# Altium schematic symbol library IC_ADI.SCHLIB: 3169 symbols (part 130 of 181) (continued)
## AD8628WARTZ-R7 (continued)
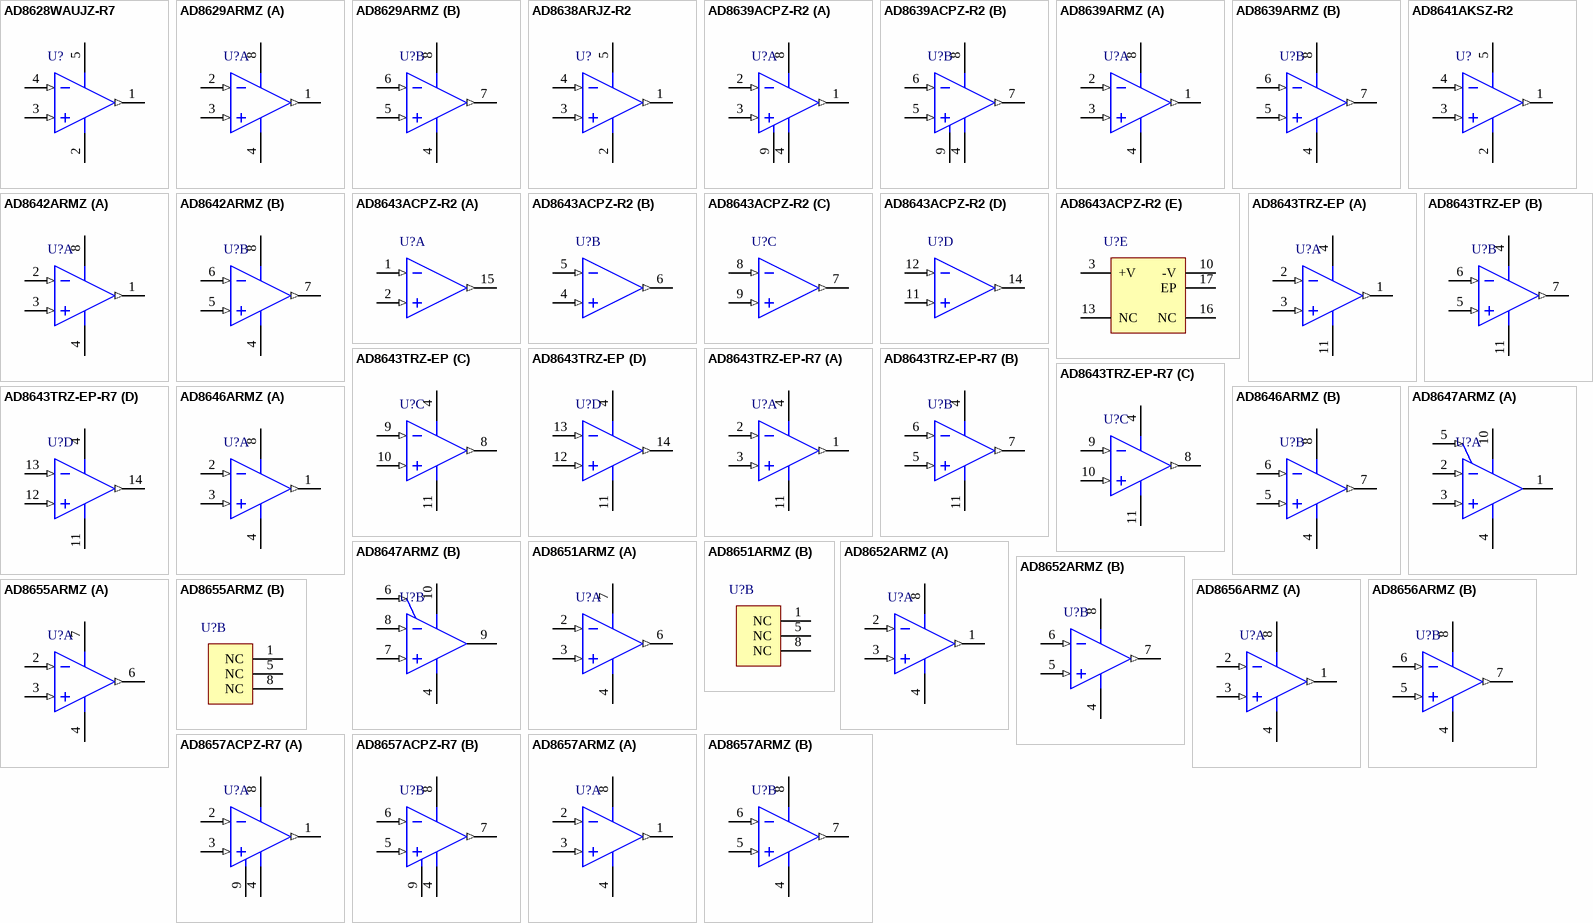
[diagram p99: symbols AD8628WAUJZ-R7 to AD8657ARMZ]

## AD8628WAUJZ-R7
designator U?
Single Channel RRIO Operational Amplifier, 2.5 MHz BW, 1 V/us SR, Automotive, 5-pin SOT23 (UJ-5), Reel; Generic Part Number: AD8628; PartNumber: AD8628WAUJZ-R7; Amplifiers Per Package: 1; Automotive Qualified: Yes; Input Bias Current: 30pA; Input Offset Voltage: 1uV; Iq/Amp: 1.1mA; Slew Rate: 1V/us; Small Signal Bandwidth: 2.5MHz; V Span Max: 6V; V Span Min: 2.7V; DatasheetVersion: Rev. I; PackageVersion: 100708-A; PackageReference: UJ-5; PackageDescription: 5-Pin Thin Small Outline Transistor Package, Body 2.9 x 1.6 mm, Pitch 0.95 mm; Supplier Part Number 1: AD8628WAUJZ-R7TR-ND; Supplier Part Number 2: AD8628WAUJZ-R7CT-ND; Supplier Part Number 3: AD8628WAUJZ-R7DKR-ND; Mounting Technology: Surface Mount; Code_JEDEC: MO-193-AB; ComponentLink1Description: Manufacturer URL; ComponentLink2Description: Datasheet; ComponentLink3Description: Package Specification; ComponentLink4Description: Reference Circuit
footprint SOT23-5 (Footprint not found)
pins: 1 OUT (out), 2 -V (power), 3 +IN (in), 4 -IN (in), 5 +V (power)

## AD8629ARMZ
designator U?
Double Channel RRIO Operational Amplifier, 2.5 MHz BW, 1 V/us SR, Industrial, 8-pin SOP (RM-8), Tube; Generic Part Number: AD8629; PartNumber: AD8629ARMZ; Amplifiers Per Package: 2; Automotive Qualified: Yes; Input Bias Current: 30pA; Input Offset Voltage: 1uV; Iq/Amp: 1.1mA; Slew Rate: 1V/us; Small Signal Bandwidth: 2.5MHz; V Span Max: 6V; V Span Min: 2.7V; DatasheetVersion: Rev. I; PackageReference: RM-8; PackageDescription: 8-Pin Mini Small Outline Package, Body 3 x 3 mm, Pitch 0.65 mm; Supplier Part Number 1: AD8629ARMZ-ND; Supplier Part Number 2: 19P8311; Mounting Technology: Surface Mount; Code_JEDEC: MO-187-AA; ComponentLink1Description: Manufacturer URL; ComponentLink2Description: Datasheet; ComponentLink3Description: Package Specification; ComponentLink4Description: Reference Circuit
footprint VSSOP8_0.65 (Footprint not found)
pins on every part: 4 -V (power), 8 +V (power)
part A pins: 1 OUT A (out), 2 -IN A (in), 3 +IN A (in)
part B pins: 5 +IN B (in), 6 -IN B (in), 7 OUT B (out)

## AD8638ARJZ-R2
designator U?
Single Channel Rail-to-Rail Operational Amplifier, 1.5 MHz BW, 2 V/us SR, Industrial, 5-pin SOT23 (RJ-5), Reel; Generic Part Number: AD8638; PartNumber: AD8638ARJZ-R2; Amplifiers Per Package: 1; Input Bias Current: 1pA; Input Offset Voltage: 3uV; Iq/Amp: 1.5mA; Slew Rate: 2V/us; Small Signal Bandwidth: 1.5MHz; V Span Max: 16V; V Span Min: 5V; DatasheetVersion: Rev. F; PackageVersion: 121608-A; PackageReference: RJ-5; PackageDescription: 5-Pin Small Outline Transistor Package, Body 2.9 x 1.6 mm, Pitch 0.95 mm; Supplier Part Number 1: AD8638ARJZ-R2TR-ND; Supplier Part Number 2: AD8638ARJZ-R2CT-ND; Supplier Part Number 3: AD8638ARJZ-R2DKR-ND; Supplier Part Number 4: 1701178; Supplier Part Number 5: 89M5025; Mounting Technology: Surface Mount; Code_JEDEC: MO-178-AA; ComponentLink1Description: Manufacturer URL; ComponentLink2Description: Datasheet; ComponentLink3Description: Package Specification; ComponentLink4Description: Reference Circuit
footprint SOT23-5 (Footprint not found)
pins: 1 OUT (out), 2 -V (power), 3 +IN (in), 4 -IN (in), 5 +V (power)

## AD8639ACPZ-R2
designator U?
Double Channel Rail-to-Rail Operational Amplifier, 1.5 MHz BW, 2 V/us SR, Industrial, 8-pin SON (CP-8-5), Reel; Generic Part Number: AD8639; PartNumber: AD8639ACPZ-R2; Amplifiers Per Package: 2; Automotive Qualified: Yes; Input Bias Current: 1pA; Input Offset Voltage: 3uV; Iq/Amp: 1.5mA; Slew Rate: 2V/us; Small Signal Bandwidth: 1.5MHz; V Span Max: 16V; V Span Min: 5V; DatasheetVersion: Rev. F; PackageVersion: 031208-A; PackageReference: CP-8-5; PackageDescription: 8-Pin Lead Frame Chip Scale Package, Body 3 x 3 mm, Pitch 0.5 mm; Supplier Part Number 1: AD8639ACPZ-R2-ND; Mounting Technology: Surface Mount; ComponentLink1Description: Manufacturer URL; ComponentLink2Description: Datasheet; ComponentLink3Description: Package Specification
footprint DFN8_0.5-PAD(3X3) (Footprint not found)
pins on every part: 4 -V (power), 8 +V (power), 9 EP (power)
part A pins: 1 OUT A (out), 2 -IN A (in), 3 +IN A (in)
part B pins: 5 +IN B (in), 6 -IN B (in), 7 OUT B (out)

## AD8639ARMZ
designator U?
Double Channel Rail-to-Rail Operational Amplifier, 1.5 MHz BW, 2 V/us SR, Industrial, 8-pin SOP (RM-8), Tube; Generic Part Number: AD8639; PartNumber: AD8639ARMZ; Amplifiers Per Package: 2; Automotive Qualified: Yes; Input Bias Current: 1pA; Input Offset Voltage: 3uV; Iq/Amp: 1.5mA; Slew Rate: 2V/us; Small Signal Bandwidth: 1.5MHz; V Span Max: 16V; V Span Min: 5V; DatasheetVersion: Rev. F; PackageReference: RM-8; PackageDescription: 8-Pin Mini Small Outline Package, Body 3 x 3 mm, Pitch 0.65 mm; Supplier Part Number 1: AD8639ARMZ-ND; Supplier Part Number 2: 34P3248; Mounting Technology: Surface Mount; Code_JEDEC: MO-187-AA; ComponentLink1Description: Manufacturer URL; ComponentLink2Description: Datasheet; ComponentLink3Description: Package Specification
footprint VSSOP8_0.65 (Footprint not found)
pins on every part: 4 -V (power), 8 +V (power)
part A pins: 1 OUT A (out), 2 -IN A (in), 3 +IN A (in)
part B pins: 5 +IN B (in), 6 -IN B (in), 7 OUT B (out)

## AD8641AKSZ-R2
designator U?
Single Channel Very Low Input Bias Current Operational Amplifier, 3 MHz BW, 2 V/us SR, Industrial, 5-pin SOT23 (KS-5), Reel; Generic Part Number: AD8641; PartNumber: AD8641AKSZ-R2; Amplifiers Per Package: 1; Input Bias Current: 250fA; Input Offset Voltage: 50uV; Iq/Amp: 250礎; Slew Rate: 2V/us; Small Signal Bandwidth: 3MHz; V Span Max: 26V; V Span Min: 5V; DatasheetVersion: Rev. E; PackageVersion: 072809-A; PackageReference: KS-5; PackageDescription: 5-Pin Thin Shrink Small Outline Transistor Package, Body 2 x 1.25 mm, Pitch 0.65 mm; Supplier Part Number 1: AD8641AKSZ-R2-ND; Supplier Part Number 2: 19M8935; Mounting Technology: Surface Mount; Code_JEDEC: MO-203-AA; ComponentLink1Description: Manufacturer URL; ComponentLink2Description: Datasheet; ComponentLink3Description: Package Specification; ComponentLink4Description: Reference Circuit
footprint SOT353 (Footprint not found)
pins: 1 OUT (out), 2 VEE (power), 3 +IN (in), 4 -IN (in), 5 VCC (power)

## AD8642ARMZ
designator U?
Double Channel Very Low Input Bias Current Operational Amplifier, 3.5 MHz BW, 3 V/us SR, Industrial, 8-pin SOP (RM-8), Tube; Generic Part Number: AD8642; PartNumber: AD8642ARMZ; Amplifiers Per Package: 2; Input Bias Current: 250fA; Input Offset Voltage: 50uV; Iq/Amp: 290uA; Slew Rate: 3V/us; Small Signal Bandwidth: 3.5MHz; V Span Max: 26V; V Span Min: 5V; DatasheetVersion: Rev. E; PackageReference: RM-8; PackageDescription: 8-Pin Mini Small Outline Package, Body 3 x 3 mm, Pitch 0.65 mm; Supplier Part Number 1: AD8642ARMZ-ND; Supplier Part Number 2: 45P6468; Mounting Technology: Surface Mount; Code_JEDEC: MO-187-AA; ComponentLink1Description: Manufacturer URL; ComponentLink2Description: Datasheet; ComponentLink3Description: Package Specification
footprint VSSOP8_0.65 (Footprint not found)
pins on every part: 4 -V (power), 8 +V (power)
part A pins: 1 OUT A (out), 2 -IN A (in), 3 +IN A (in)
part B pins: 5 +IN B (in), 6 -IN B (in), 7 OUT B (out)

## AD8643ACPZ-R2
designator U?
Quad Channel Very Low Input Bias Current Operational Amplifier, 3.5 MHz BW, 3 V/us SR, Industrial, 16-pin QFN (CP-16-3), Reel; Generic Part Number: AD8643; PartNumber: AD8643ACPZ-R2; Amplifiers Per Package: 4; Input Bias Current: 250fA; Input Offset Voltage: 50uV; Iq/Amp: 290uA; Slew Rate: 3V/us; Small Signal Bandwidth: 3.5MHz; V Span Max: 26V; V Span Min: 5V; DatasheetVersion: Rev. E; PackageReference: CP-16-3; PackageDescription: 16-Pin Lead Frame Chip Scale Package, Body 3 x 3 mm, Pitch 0.5 mm; Supplier Part Number 1: AD8643ACPZ-R2TR-ND; Supplier Part Number 2: AD8643ACPZ-R2CT-ND; Supplier Part Number 3: AD8643ACPZ-R2DKR-ND; Supplier Part Number 4: 19M8937; Mounting Technology: Surface Mount; Code_JEDEC: MO-220-VEED-2; ComponentLink1Description: Manufacturer URL; ComponentLink2Description: Datasheet; ComponentLink3Description: Package Specification
footprint QFN16_0.5-PAD(3X3) (Footprint not found)
part A pins: 1 -IN A (in), 2 +IN A (in), 15 OUT A (out)
part B pins: 4 +IN B (in), 5 -IN B (in), 6 OUT B (out)
part C pins: 7 OUT C (out), 8 -IN C (in), 9 +IN C (in)
part D pins: 11 +IN D (in), 12 -IN D (in), 14 OUT D (out)
part E pins: 3 +V (power), 10 -V (power), 13 NC, 16 NC, 17 EP (power) "IT IS RECOMMENDED TO CONNECT THE EXPOSED PAD TO V-."

## AD8643TRZ-EP
designator U?
Quad Channel Very Low Input Bias Current Operational Amplifier, 3.5 MHz BW, 3 V/us SR, Military, 14-pin SOIC (R-14), Tube; Generic Part Number: AD8643; PartNumber: AD8643TRZ-EP; Amplifiers Per Package: 4; Input Bias Current: 250fA; Input Offset Voltage: 50uV; Iq/Amp: 290uA; Slew Rate: 3V/us; Small Signal Bandwidth: 3.5MHz; V Span Max: 26V; V Span Min: 5V; DatasheetVersion: Rev. E; PackageVersion: 060606-A; PackageReference: R-14; PackageDescription: 14-Pin Standard Small Outline Package, Body 8.65 x 3.9 mm, Pitch 1.27 mm; Supplier Part Number 1: AD8643TRZ-EP-ND; Mounting Technology: Surface Mount; Code_JEDEC: MS-012-AB; ComponentLink1Description: Manufacturer URL; ComponentLink2Description: Datasheet; ComponentLink3Description: Package Specification
footprint SOIC14_1.27 (Footprint not found)
pins on every part: 4 +V (power), 11 -V (power)
part A pins: 1 OUT A (out), 2 -IN A (in), 3 +IN A (in)
part B pins: 5 +IN B (in), 6 -IN B (in), 7 OUT B (out)
part C pins: 8 OUT C (out), 9 -IN C (in), 10 +IN C (in)
part D pins: 12 +IN D (in), 13 -IN D (in), 14 OUT D (out)

## AD8643TRZ-EP-R7
designator U?
Quad Channel Very Low Input Bias Current Operational Amplifier, 3.5 MHz BW, 3 V/us SR, Military, 14-pin SOIC (R-14), Reel; Generic Part Number: AD8643; PartNumber: AD8643TRZ-EP-R7; Amplifiers Per Package: 4; Input Bias Current: 250fA; Input Offset Voltage: 50uV; Iq/Amp: 290uA; Slew Rate: 3V/us; Small Signal Bandwidth: 3.5MHz; V Span Max: 26V; V Span Min: 5V; DatasheetVersion: Rev. E; PackageVersion: 060606-A; PackageReference: R-14; PackageDescription: 14-Pin Standard Small Outline Package, Body 8.65 x 3.9 mm, Pitch 1.27 mm; Supplier Part Number 1: AD8643TRZ-EP-R7TR-ND; Supplier Part Number 2: AD8643TRZ-EP-R7CT-ND; Supplier Part Number 3: AD8643TRZ-EP-R7DKR-ND; Mounting Technology: Surface Mount; Code_JEDEC: MS-012-AB; ComponentLink1Description: Manufacturer URL; ComponentLink2Description: Datasheet; ComponentLink3Description: Package Specification
footprint SOIC14_1.27 (Footprint not found)
pins on every part: 4 +V (power), 11 -V (power)
part A pins: 1 OUT A (out), 2 -IN A (in), 3 +IN A (in)
part B pins: 5 +IN B (in), 6 -IN B (in), 7 OUT B (out)
part C pins: 8 OUT C (out), 9 -IN C (in), 10 +IN C (in)
part D pins: 12 +IN D (in), 13 -IN D (in), 14 OUT D (out)

## AD8646ARMZ
designator U?
Double Channel Wide Bandwidth Operational Amplifier, 24 MHz BW, 11 V/us SR, Industrial, 8-pin SOP (RM-8), Tube; Generic Part Number: AD8646; PartNumber: AD8646ARMZ; Amplifiers Per Package: 2; Automotive Qualified: Yes; Input Bias Current: 300fA; Input Offset Voltage: 600uV; Iq/Amp: 2mA; Slew Rate: 11V/us; Small Signal Bandwidth: 24MHz; V Span Max: 5.5V; V Span Min: 2.7V; DatasheetVersion: Rev. D; PackageReference: RM-8; PackageDescription: 8-Pin Mini Small Outline Package, Body 3 x 3 mm, Pitch 0.65 mm; Supplier Part Number 1: AD8646ARMZ-ND; Supplier Part Number 2: 2094200; Supplier Part Number 3: 34P3249; Mounting Technology: Surface Mount; Code_JEDEC: MO-187-AA; ComponentLink1Description: Manufacturer URL; ComponentLink2Description: Datasheet; ComponentLink3Description: Package Specification; ComponentLink4Description: Reference Circuit
footprint VSSOP8_0.65 (Footprint not found)
pins on every part: 4 -V (power), 8 +V (power)
part A pins: 1 OUT A (out), 2 -IN A (in), 3 +IN A (in)
part B pins: 5 +IN B (in), 6 -IN B (in), 7 OUT B (out)

## AD8647ARMZ
designator U?
Double Channel Wide Bandwidth Operational Amplifier, 24 MHz BW, 11 V/us SR, Industrial, 10-pin SOP (RM-10), Tube; Generic Part Number: AD8647; PartNumber: AD8647ARMZ; Amplifiers Per Package: 2; Input Bias Current: 300fA; Input Offset Voltage: 600uV; Iq/Amp: 2mA; Slew Rate: 11V/us; Small Signal Bandwidth: 24MHz; V Span Max: 5.5V; V Span Min: 2.7V; DatasheetVersion: Rev. D; PackageReference: RM-10; PackageDescription: 10-Pin Mini Small Outline Package, Body 3 x 3 mm, Pitch 0.5 mm; Supplier Part Number 1: AD8647ARMZ-ND; Supplier Part Number 2: 34P3250; Mounting Technology: Surface Mount; Code_JEDEC: MO-187-BA; ComponentLink1Description: Manufacturer URL; ComponentLink2Description: Datasheet; ComponentLink3Description: Package Specification
footprint VSSOP10_0.5 (Footprint not found)
pins on every part: 4 -V (power), 10 +V (power)
part A pins: 1 OUT A (hiz), 2 -IN A (in), 3 +IN A (in), 5 ~{SDA} (in)
part B pins: 6 ~{SDB} (in), 7 +IN B (in), 8 -IN B (in), 9 OUT B (hiz)

## AD8651ARMZ
designator U?
Single Channel RRIO Operational Amplifier, 50 MHz BW, 41 V/us SR, Industrial, 8-pin SOP (RM-8), Tube; Generic Part Number: AD8651; PartNumber: AD8651ARMZ; Amplifiers Per Package: 1; Input Bias Current: 1pA; Input Offset Voltage: 100uV; Iq/Amp: 9mA; Slew Rate: 41V/us; Small Signal Bandwidth: 50MHz; V Span Max: 5.5V; V Span Min: 2.7V; DatasheetVersion: Rev. C; PackageReference: RM-8; PackageDescription: 8-Pin Mini Small Outline Package, Body 3 x 3 mm, Pitch 0.65 mm; Supplier Part Number 1: AD8651ARMZ-ND; Supplier Part Number 2: 45P6469; Mounting Technology: Surface Mount; Code_JEDEC: MO-187-AA; ComponentLink1Description: Manufacturer URL; ComponentLink2Description: Datasheet; ComponentLink3Description: Package Specification
footprint VSSOP8_0.65 (Footprint not found)
part A pins: 2 -IN (in), 3 +IN (in), 4 -V (power), 6 OUT (out), 7 +V (power)
part B pins: 1 NC, 5 NC, 8 NC

## AD8652ARMZ
designator U?
Double Channel RRIO Operational Amplifier, 50 MHz BW, 41 V/us SR, Industrial, 8-pin SOP (RM-8), Tube; Generic Part Number: AD8652; PartNumber: AD8652ARMZ; Amplifiers Per Package: 2; Input Bias Current: 1pA; Input Offset Voltage: 100uV; Iq/Amp: 9mA; Slew Rate: 41V/us; Small Signal Bandwidth: 50MHz; V Span Max: 5.5V; V Span Min: 2.7V; DatasheetVersion: Rev. C; PackageReference: RM-8; PackageDescription: 8-Pin Mini Small Outline Package, Body 3 x 3 mm, Pitch 0.65 mm; Supplier Part Number 1: AD8652ARMZ-ND; Supplier Part Number 2: 45P6470; Mounting Technology: Surface Mount; Code_JEDEC: MO-187-AA; ComponentLink1Description: Manufacturer URL; ComponentLink2Description: Datasheet; ComponentLink3Description: Package Specification
footprint VSSOP8_0.65 (Footprint not found)
pins on every part: 4 -V (power), 8 +V (power)
part A pins: 1 OUT A (out), 2 -IN A (in), 3 +IN A (in)
part B pins: 5 +IN B (in), 6 -IN B (in), 7 OUT B (out)

## AD8655ARMZ
designator U?
Single Channel Low Offset Voltage Operational Amplifier, 28 MHz BW, 11 V/us SR, Industrial, 8-pin SOP (RM-8), Tube; Generic Part Number: AD8655; PartNumber: AD8655ARMZ; Amplifiers Per Package: 1; Input Bias Current: 1pA; Input Offset Voltage: 50uV; Iq/Amp: 4.5mA; Slew Rate: 11V/us; Small Signal Bandwidth: 28MHz; V Span Max: 5.5V; V Span Min: 2.7V; DatasheetVersion: Rev. B; PackageReference: RM-8; PackageDescription: 8-Pin Mini Small Outline Package, Body 3 x 3 mm, Pitch 0.65 mm; Supplier Part Number 1: AD8655ARMZ-ND; Supplier Part Number 2: 2112576; Supplier Part Number 3: 34P3251; Mounting Technology: Surface Mount; Code_JEDEC: MO-187-AA; ComponentLink1Description: Manufacturer URL; ComponentLink2Description: Datasheet; ComponentLink3Description: Package Specification; ComponentLink4Description: Reference Circuit
footprint VSSOP8_0.65 (Footprint not found)
part A pins: 2 -IN (in), 3 +IN (in), 4 -V (power), 6 OUT (out), 7 +V (power)
part B pins: 1 NC, 5 NC, 8 NC

## AD8656ARMZ
designator U?
Double Channel RRIO Operational Amplifier, 28 MHz BW, 11 V/us SR, Industrial, 8-pin SOP (RM-8), Tube; Generic Part Number: AD8656; PartNumber: AD8656ARMZ; Amplifiers Per Package: 2; Automotive Qualified: Yes; Input Bias Current: 1pA; Input Offset Voltage: 50uV; Iq/Amp: 4.5mA; Slew Rate: 11V/us; Small Signal Bandwidth: 28MHz; V Span Max: 5.5V; V Span Min: 2.7V; DatasheetVersion: Rev. B; PackageReference: RM-8; PackageDescription: 8-Pin Mini Small Outline Package, Body 3 x 3 mm, Pitch 0.65 mm; Supplier Part Number 1: AD8656ARMZ-ND; Supplier Part Number 2: 1858055; Supplier Part Number 3: 34P3252; Mounting Technology: Surface Mount; Code_JEDEC: MO-187-AA; ComponentLink1Description: Manufacturer URL; ComponentLink2Description: Datasheet; ComponentLink3Description: Package Specification
footprint VSSOP8_0.65 (Footprint not found)
pins on every part: 4 -V (power), 8 +V (power)
part A pins: 1 OUT A (out), 2 -IN A (in), 3 +IN A (in)
part B pins: 5 +IN B (in), 6 -IN B (in), 7 OUT B (out)

## AD8657ACPZ-R7
designator U?
Double Channel Single-Supply Operation Operational Amplifier, 200 KHz BW, 50 mV/us SR, Industrial, 8-pin SON (CP-8-11), Reel; Generic Part Number: AD8657; PartNumber: AD8657ACPZ-R7; Amplifiers Per Package: 2; Input Bias Current: 1pA; Input Offset Voltage: 350uV; Iq/Amp: 18uA; Small Signal Bandwidth: 200KHz; V Span Max: 18V; V Span Min: 2.7V; DatasheetVersion: Rev. B; PackageVersion: 01-24-2011-B; PackageReference: CP-8-11; PackageDescription: 8-Pin Lead Frame Chip Scale Package, Body 3 x 3 mm, Pitch 0.5 mm; Supplier Part Number 1: AD8657ACPZ-R7TR-ND; Supplier Part Number 2: AD8657ACPZ-R7CT-ND; Supplier Part Number 3: AD8657ACPZ-R7DKR-ND; Packing: Reel; Slew Rate: 50mV/us; Mounting Technology: Surface Mount; Code_JEDEC: MO-229-WEED; ComponentLink1Description: Manufacturer URL; ComponentLink2Description: Datasheet; ComponentLink3Description: Package Specification; ComponentLink4Description: Reference Circuit
footprint DFN8_0.5-PAD(3X3) (Footprint not found)
pins on every part: 4 -V (power) "Negative Supply Voltage.", 8 +V (power) "Positive Supply Voltage.", 9 EP "Exposed Pad (LFCSP Only). Connect the exposed pad to V? or leave it unconnected."
part A pins: 1 OUT A (out) "Output, Channel A.", 2 -IN A (in) "Inverting Input, Channel A.", 3 +IN A (in) "Noninverting Input, Channel A."
part B pins: 5 +IN B (in) "Noninverting Input, Channel B.", 6 -IN B (in) "Inverting Input, Channel B.", 7 OUT B (out) "Output, Channel B."

## AD8657ARMZ
designator U?
Double Channel Single-Supply Operation Operational Amplifier, 200 KHz BW, 50 mV/us SR, Industrial, 8-pin SOP (RM-8), Tube; Generic Part Number: AD8657; PartNumber: AD8657ARMZ; Amplifiers Per Package: 2; Input Bias Current: 1pA; Input Offset Voltage: 350uV; Iq/Amp: 18uA; Small Signal Bandwidth: 200KHz; V Span Max: 18V; V Span Min: 2.7V; DatasheetVersion: Rev. B; PackageReference: RM-8; PackageDescription: 8-Pin Mini Small Outline Package, Body 3 x 3 mm, Pitch 0.65 mm; Supplier Part Number 1: AD8657ARMZ-ND; Supplier Part Number 2: 1897110; Supplier Part Number 3: 31T9330; Packing: Tube; Slew Rate: 50mV/us; Mounting Technology: Surface Mount; Code_JEDEC: MO-187-AA; ComponentLink1Description: Manufacturer URL; ComponentLink2Description: Datasheet; ComponentLink3Description: Package Specification; ComponentLink4Description: Reference Circuit
footprint VSSOP8_0.65 (Footprint not found)
pins on every part: 4 -V (power), 8 +V (power)
part A pins: 1 OUT A (out), 2 -IN A (in), 3 +IN A (in)
part B pins: 5 +IN B (in), 6 -IN B (in), 7 OUT B (out)

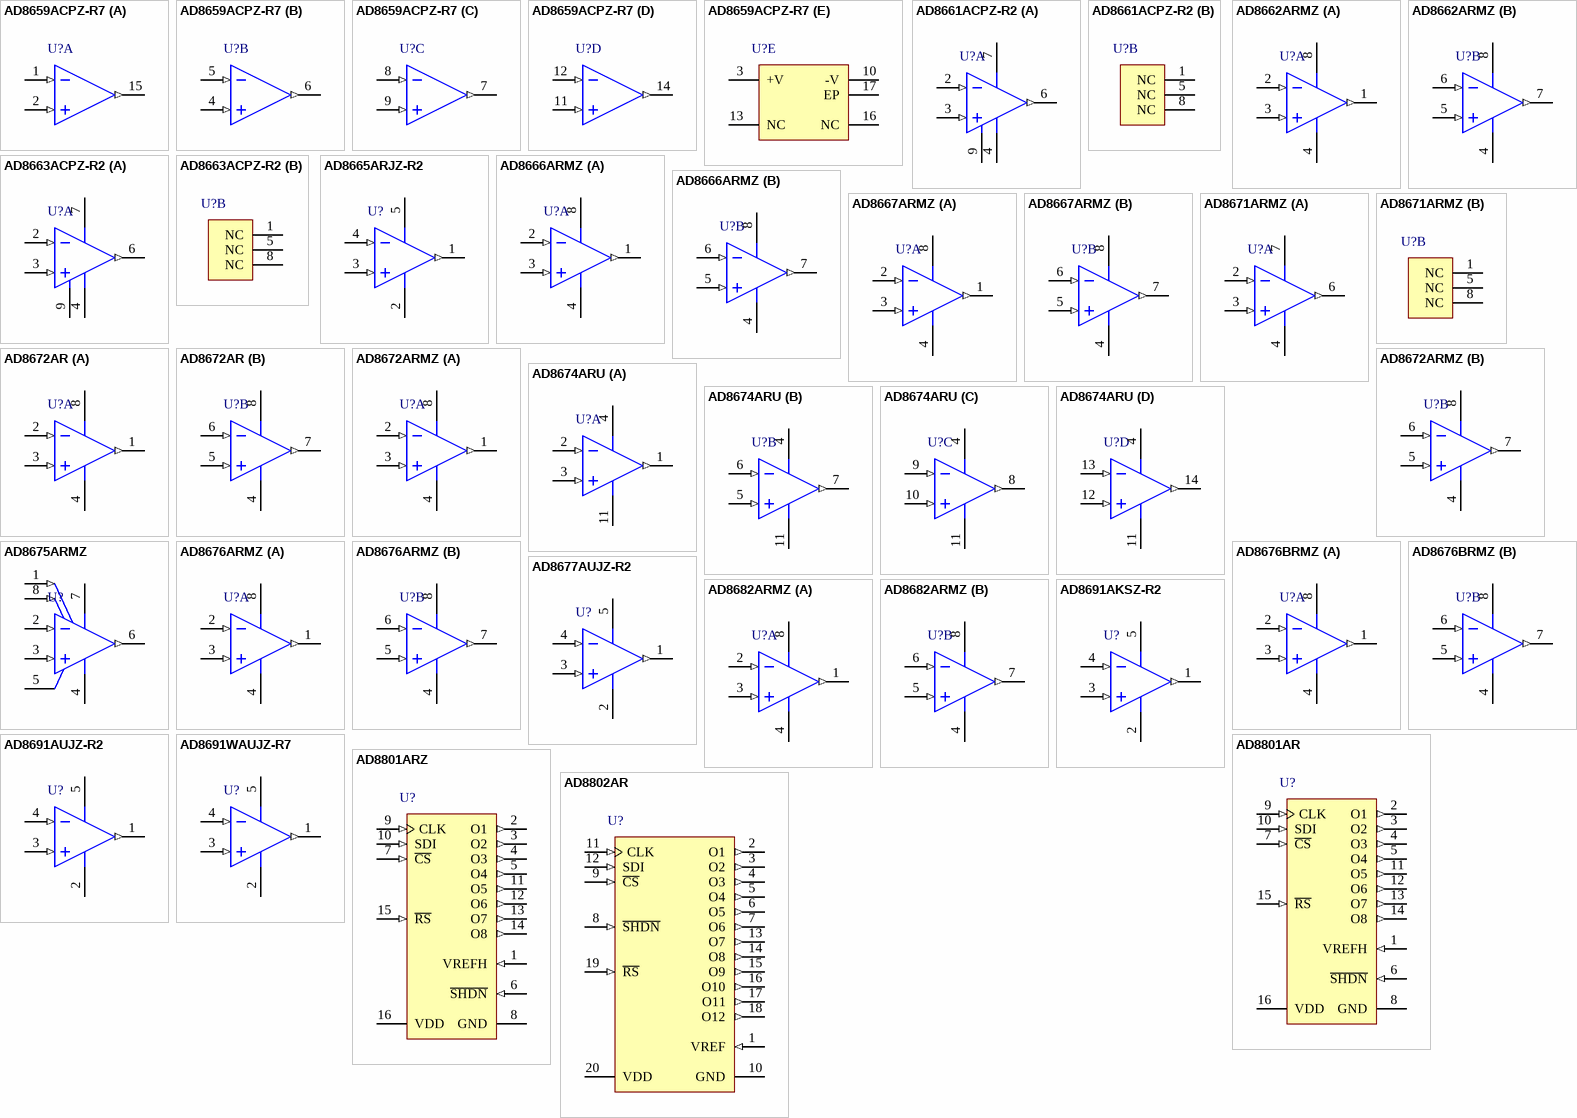
[diagram p100: symbols AD8659ACPZ-R7 to AD8802AR]

## AD8659ACPZ-R7
designator U?
Quad Channel Single-Supply Operation Operational Amplifier, 230 KHz BW, 75 mV/us SR, Industrial, 16-pin QFN (CP-16-20), Reel; Generic Part Number: AD8659; PartNumber: AD8659ACPZ-R7; Amplifiers Per Package: 4; Input Bias Current: 2pA; Input Offset Voltage: 350uV; Iq/Amp: 18uA; Small Signal Bandwidth: 230KHz; V Span Max: 18V; V Span Min: 2.7V; DatasheetVersion: Rev. B; PackageVersion: 101408-A; PackageReference: CP-16-20; PackageDescription: 16-Pin Lead Frame Chip Scale Package, Body 4 x 4 mm, Pitch 0.65 mm; Supplier Part Number 1: AD8659ACPZ-R7TR-ND; Supplier Part Number 2: AD8659ACPZ-R7CT-ND; Supplier Part Number 3: AD8659ACPZ-R7DKR-ND; Packing: Reel; Slew Rate: 75mV/us; Mounting Technology: Surface Mount; Code_JEDEC: MO-220-WGGD; ComponentLink1Description: Manufacturer URL; ComponentLink2Description: Datasheet; ComponentLink3Description: Package Specification
footprint QFN16_0.65-PAD(4x4) (Footprint not found)
part A pins: 1 -IN A (in) "Negative Input Channel A.", 2 +IN A (in) "Positive Input Channel A.", 15 OUT A (out) "Output Channel C."
part B pins: 4 +IN B (in) "Positive Input Channel B.", 5 -IN B (in) "Negative Input Channel B.", 6 OUT B (out) "Output Channel B."
part C pins: 7 OUT C (out) "Output Channel C.", 8 -IN C (in) "Negative Input Channel C.", 9 +IN C (in) "Positive Input Channel C."
part D pins: 11 +IN D (in) "Positive Input Channel D.", 12 -IN D (in) "Negative Input Channel D.", 14 OUT D (out) "Output Channel D."
part E pins: 3 +V (power) "Positive Supply Voltage.", 10 -V (power) "Negative Supply Voltage.", 13 NC "No Internal Connection", 16 NC "No Internal Connection", 17 EP "Exposed Pad. For the AD8659 (16-lead LFCSP only), connect the exposed pad to V- or leave it unconnected"

## AD8661ACPZ-R2
designator U?
Single Channel Wide Bandwidth Operational Amplifier, 4 MHz BW, 3.5 V/us SR, Industrial, 8-pin QFN (CP-8-2), Reel; Generic Part Number: AD8661; PartNumber: AD8661ACPZ-R2; Amplifiers Per Package: 1; Input Bias Current: 300fA; Input Offset Voltage: 30uV; Iq/Amp: 1.4mA; Small Signal Bandwidth: 4MHz; V Span Max: 16V; V Span Min: 5V; DatasheetVersion: Rev. D; PackageVersion: 061507-B; PackageReference: CP-8-2; PackageDescription: 8-Pin Lead Frame Chip Scale Package, Body 3 x 3 mm, Pitch 0.5 mm; Supplier Part Number 1: AD8661ACPZ-R2TR-ND; Supplier Part Number 2: AD8661ACPZ-R2CT-ND; Supplier Part Number 3: AD8661ACPZ-R2DKR-ND; Slew Rate: 3.5V/us; Mounting Technology: Surface Mount; ComponentLink1Description: Manufacturer URL; ComponentLink2Description: Datasheet; ComponentLink3Description: Package Specification
footprint DFN8_0.5-PAD(3X3) (Footprint not found)
part A pins: 2 -IN (in), 3 +IN (in), 4 -V (power), 6 OUT (out), 7 +V (power), 9 EP
part B pins: 1 NC, 5 NC, 8 NC

## AD8662ARMZ
designator U?
Double Channel Wide Bandwidth Operational Amplifier, 4 MHz BW, 3.5 V/us SR, Industrial, 8-pin SOP (RM-8), Tube; Generic Part Number: AD8662; PartNumber: AD8662ARMZ; Amplifiers Per Package: 2; Input Bias Current: 300fA; Input Offset Voltage: 1mV; Iq/Amp: 1.55mA; Small Signal Bandwidth: 4MHz; V Span Max: 16V; V Span Min: 5V; DatasheetVersion: Rev. D; PackageReference: RM-8; PackageDescription: 8-Pin Mini Small Outline Package, Body 3 x 3 mm, Pitch 0.65 mm; Supplier Part Number 1: AD8662ARMZ-ND; Supplier Part Number 2: 34P3253; Slew Rate: 3.5V/us; Mounting Technology: Surface Mount; Code_JEDEC: MO-187-AA; ComponentLink1Description: Manufacturer URL; ComponentLink2Description: Datasheet; ComponentLink3Description: Package Specification; ComponentLink4Description: Reference Circuit
footprint VSSOP8_0.65 (Footprint not found)
pins on every part: 4 -V (power), 8 +V (power)
part A pins: 1 OUT A (out), 2 -IN A (in), 3 +IN A (in)
part B pins: 5 +IN B (in), 6 -IN B (in), 7 OUT B (out)

## AD8663ACPZ-R2
designator U?
Single Channel Single-Supply Operation Operational Amplifier, 540 KHz BW, 300 mV/us SR, Industrial, 8-pin QFN (CP-8-2), Reel; Generic Part Number: AD8663; PartNumber: AD8663ACPZ-R2; Amplifiers Per Package: 1; Input Bias Current: 300fA; Input Offset Voltage: 40uV; Iq/Amp: 285uA; Small Signal Bandwidth: 540KHz; V Span Max: 16V; V Span Min: 5V; DatasheetVersion: Rev. B; PackageVersion: 061507-B; PackageReference: CP-8-2; PackageDescription: 8-Pin Lead Frame Chip Scale Package, Body 3 x 3 mm, Pitch 0.5 mm; Supplier Part Number 1: AD8663ACPZ-R2TR-ND; Supplier Part Number 2: AD8663ACPZ-R2CT-ND; Supplier Part Number 3: AD8663ACPZ-R2DKR-ND; Slew Rate: 300mV/us; Mounting Technology: Surface Mount; ComponentLink1Description: Manufacturer URL; ComponentLink2Description: Datasheet; ComponentLink3Description: Package Specification; ComponentLink4Description: Reference Circuit
footprint DFN8_0.5-PAD(3X3) (Footprint not found)
part A pins: 2 -IN (in), 3 +IN (in), 4 -V (power), 6 OUT (out), 7 +V (power), 9 EP
part B pins: 1 NC, 5 NC, 8 NC

## AD8665ARJZ-R2
designator U?
Single Channel Wide Bandwidth Operational Amplifier, 4 MHz BW, 3.5 V/us SR, Industrial, 5-pin SOT23 (RJ-5), Reel; Generic Part Number: AD8665; PartNumber: AD8665ARJZ-R2; Amplifiers Per Package: 1; Input Bias Current: 200fA; Input Offset Voltage: 600uV; Iq/Amp: 1.55mA; Small Signal Bandwidth: 4MHz; V Span Max: 16V; V Span Min: 5V; DatasheetVersion: Rev. B; PackageVersion: 121608-A; PackageReference: RJ-5; PackageDescription: 5-Pin Small Outline Transistor Package, Body 2.9 x 1.6 mm, Pitch 0.95 mm; Supplier Part Number 1: AD8665ARJZ-R2-ND; Supplier Part Number 2: 1699551; Supplier Part Number 3: 28M4137; Slew Rate: 3.5V/us; Mounting Technology: Surface Mount; Code_JEDEC: MO-178-AA; ComponentLink1Description: Manufacturer URL; ComponentLink2Description: Datasheet; ComponentLink3Description: Package Specification
footprint SOT23-5 (Footprint not found)
pins: 1 OUT (out), 2 -V (power), 3 +IN (in), 4 -IN (in), 5 +V (power)

## AD8666ARMZ
designator U?
Double Channel Wide Bandwidth Operational Amplifier, 4 MHz BW, 3.5 V/us SR, Industrial, 8-pin SOP (RM-8), Tube; Generic Part Number: AD8666; PartNumber: AD8666ARMZ; Amplifiers Per Package: 2; Input Bias Current: 200fA; Input Offset Voltage: 600uV; Iq/Amp: 1.55mA; Small Signal Bandwidth: 4MHz; V Span Max: 16V; V Span Min: 5V; DatasheetVersion: Rev. B; PackageReference: RM-8; PackageDescription: 8-Pin Mini Small Outline Package, Body 3 x 3 mm, Pitch 0.65 mm; Supplier Part Number 1: AD8666ARMZ-ND; Supplier Part Number 2: 14R8724; Slew Rate: 3.5V/us; Mounting Technology: Surface Mount; Code_JEDEC: MO-187-AA; ComponentLink1Description: Manufacturer URL; ComponentLink2Description: Datasheet; ComponentLink3Description: Package Specification
footprint VSSOP8_0.65 (Footprint not found)
pins on every part: 4 -V (power), 8 +V (power)
part A pins: 1 OUT A (out), 2 -IN A (in), 3 +IN A (in)
part B pins: 5 +IN B (in), 6 -IN B (in), 7 OUT B (out)

## AD8667ARMZ
designator U?
Double Channel Single-Supply Operation Operational Amplifier, 520 KHz BW, 260 mV/us SR, Industrial, 8-pin SOP (RM-8), Tube; Generic Part Number: AD8667; PartNumber: AD8667ARMZ; Amplifiers Per Package: 2; Input Bias Current: 300fA; Input Offset Voltage: 30uV; Iq/Amp: 285uA; Small Signal Bandwidth: 520KHz; V Span Max: 16V; V Span Min: 5V; DatasheetVersion: Rev. B; PackageReference: RM-8; PackageDescription: 8-Pin Mini Small Outline Package, Body 3 x 3 mm, Pitch 0.65 mm; Supplier Part Number 1: AD8667ARMZ-ND; Slew Rate: 260mV/us; Mounting Technology: Surface Mount; Code_JEDEC: MO-187-AA; ComponentLink1Description: Manufacturer URL; ComponentLink2Description: Datasheet; ComponentLink3Description: Package Specification
footprint VSSOP8_0.65 (Footprint not found)
pins on every part: 4 -V (power), 8 +V (power)
part A pins: 1 OUT A (out), 2 -IN A (in), 3 +IN A (in)
part B pins: 5 +IN B (in), 6 -IN B (in), 7 OUT B (out)

## AD8671ARMZ
designator U?
Single Channel Wide Bandwidth Operational Amplifier, 10 MHz BW, 4 V/us SR, Industrial, 8-pin SOP (RM-8), Tube; Generic Part Number: AD8671; PartNumber: AD8671ARMZ; Amplifiers Per Package: 1; Input Bias Current: 3nA; Input Offset Voltage: 20uV; Iq/Amp: 3.5mA; Slew Rate: 4V/us; Small Signal Bandwidth: 10MHz; V Span Max: 36V; V Span Min: 10V; DatasheetVersion: Rev. E; PackageReference: RM-8; PackageDescription: 8-Pin Mini Small Outline Package, Body 3 x 3 mm, Pitch 0.65 mm; Supplier Part Number 1: AD8671ARMZ-ND; Supplier Part Number 2: 1739328; Supplier Part Number 3: 19P8315; Mounting Technology: Surface Mount; Code_JEDEC: MO-187-AA; ComponentLink1Description: Manufacturer URL; ComponentLink2Description: Datasheet; ComponentLink3Description: Package Specification
footprint VSSOP8_0.65 (Footprint not found)
part A pins: 2 -IN (in), 3 +IN (in), 4 -V (power), 6 OUT (out), 7 +V (power)
part B pins: 1 NC, 5 NC, 8 NC

## AD8672AR
designator U?
Double Channel Wide Bandwidth Operational Amplifier, 10 MHz BW, 4 V/us SR, Industrial, 8-pin SOIC (R-8), Tube; Generic Part Number: AD8672; PartNumber: AD8672AR; Amplifiers Per Package: 2; Input Bias Current: 3nA; Input Offset Voltage: 20uV; Iq/Amp: 3.5mA; Slew Rate: 4V/us; Small Signal Bandwidth: 10MHz; V Span Max: 36V; V Span Min: 10V; DatasheetVersion: Rev. E; PackageVersion: 060506-A; PackageReference: R-8; PackageDescription: 8-Pin Standard Small Outline Package, Body 3.9 x 4.9 mm, Pitch 1.27 mm; Supplier Part Number 1: AD8672AR-ND; Mounting Technology: Surface Mount; Code_JEDEC: MS-012-AA; ComponentLink1Description: Manufacturer URL; ComponentLink2Description: Datasheet; ComponentLink3Description: Package Specification; ComponentLink4Description: Reference Circuit
footprint SOIC8_1.27 (Footprint not found)
pins on every part: 4 -V (power), 8 +V (power)
part A pins: 1 OUT A (out), 2 -IN A (in), 3 +IN A (in)
part B pins: 5 +IN B (in), 6 -IN B (in), 7 OUT B (out)

## AD8672ARMZ
designator U?
Double Channel Wide Bandwidth Operational Amplifier, 10 MHz BW, 4 V/us SR, Industrial, 8-pin SOP (RM-8), Tube; Generic Part Number: AD8672; PartNumber: AD8672ARMZ; Amplifiers Per Package: 2; Input Bias Current: 3nA; Input Offset Voltage: 20uV; Iq/Amp: 3.5mA; Slew Rate: 4V/us; Small Signal Bandwidth: 10MHz; V Span Max: 30V; V Span Min: 10V; DatasheetVersion: Rev. E; PackageReference: RM-8; PackageDescription: 8-Pin Mini Small Outline Package, Body 3 x 3 mm, Pitch 0.65 mm; Supplier Part Number 1: AD8672ARMZ-ND; Supplier Part Number 2: 2102512; Supplier Part Number 3: 19P8316; Mounting Technology: Surface Mount; Code_JEDEC: MO-187-AA; ComponentLink1Description: Manufacturer URL; ComponentLink2Description: Datasheet; ComponentLink3Description: Package Specification; ComponentLink4Description: Reference Circuit
footprint VSSOP8_0.65 (Footprint not found)
pins on every part: 4 -V (power), 8 +V (power)
part A pins: 1 OUT A (out), 2 -IN A (in), 3 +IN A (in)
part B pins: 5 +IN B (in), 6 -IN B (in), 7 OUT B (out)

## AD8674ARU
designator U?
Quad Channel Wide Bandwidth Operational Amplifier, 10 MHz BW, 4 V/us SR, Industrial, 14-pin SOP (RU-14), Tube; Generic Part Number: AD8674; PartNumber: AD8674ARU; Amplifiers Per Package: 4; Input Bias Current: 3nA; Input Offset Voltage: 20uV; Iq/Amp: 3.5mA; Slew Rate: 4V/us; Small Signal Bandwidth: 10MHz; V Span Max: 36V; V Span Min: 10V; DatasheetVersion: Rev. E; PackageReference: RU-14; PackageDescription: 14-Pin Thin Shrink Small Outline Package, Body 5 x 4.4 mm, Pitch 0.65 mm; Supplier Part Number 1: AD8674ARU-ND; Mounting Technology: Surface Mount; Code_JEDEC: MO-153AB-1; ComponentLink1Description: Manufacturer URL; ComponentLink2Description: Datasheet; ComponentLink3Description: Package Specification
footprint TSSOP14_0.65 (Footprint not found)
pins on every part: 4 +V (power), 11 -V (power)
part A pins: 1 OUT A (out), 2 -IN A (in), 3 +IN A (in)
part B pins: 5 +IN B (in), 6 -IN B (in), 7 OUT B (out)
part C pins: 8 OUT C (out), 9 -IN C (in), 10 +IN C (in)
part D pins: 12 +IN D (in), 13 -IN D (in), 14 OUT D (out)

## AD8675ARMZ
designator U?
Single Channel Wide Bandwidth Operational Amplifier, 10 MHz BW, 2.5 V/us SR, Industrial, 8-pin SOP (RM-8), Tube; Generic Part Number: AD8675; PartNumber: AD8675ARMZ; Amplifiers Per Package: 1; Input Bias Current: 500pA; Input Offset Voltage: 10uV; Iq/Amp: 2.9mA; Small Signal Bandwidth: 10MHz; V Span Max: 36V; V Span Min: 10V; DatasheetVersion: Rev. E; PackageReference: RM-8; PackageDescription: 8-Pin Mini Small Outline Package, Body 3 x 3 mm, Pitch 0.65 mm; Supplier Part Number 1: AD8675ARMZ-ND; Supplier Part Number 2: 2074881; Supplier Part Number 3: 76T1839; Supplier Part Number 4: 34P3255; Slew Rate: 2.5V/us; Mounting Technology: Surface Mount; Code_JEDEC: MO-187-AA; ComponentLink1Description: Manufacturer URL; ComponentLink2Description: Datasheet; ComponentLink3Description: Package Specification; ComponentLink4Description: Reference Circuit
footprint VSSOP8_0.65 (Footprint not found)
pins: 1 NULL (in), 2 -IN (in), 3 +IN (in), 4 -V (power), 5 NC, 6 OUT (out), 7 +V (power), 8 NULL (in)

## AD8676ARMZ
designator U?
Double Channel Wide Bandwidth Operational Amplifier, 10 MHz BW, 2.5 V/us SR, Industrial, 8-pin SOP (RM-8), Tube; Generic Part Number: AD8676; PartNumber: AD8676ARMZ; Amplifiers Per Package: 2; Input Bias Current: 2.4nA; Input Offset Voltage: 12uV; Iq/Amp: 2.7mA; Small Signal Bandwidth: 10MHz; V Span Max: 36V; V Span Min: 10V; DatasheetVersion: Rev. C; PackageReference: RM-8; PackageDescription: 8-Pin Mini Small Outline Package, Body 3 x 3 mm, Pitch 0.65 mm; Supplier Part Number 1: AD8676ARMZ-ND; Supplier Part Number 2: 1776909; Supplier Part Number 3: 45P6471; Slew Rate: 2.5V/us; Mounting Technology: Surface Mount; Code_JEDEC: MO-187-AA; ComponentLink1Description: Manufacturer URL; ComponentLink2Description: Datasheet; ComponentLink3Description: Package Specification; ComponentLink4Description: Reference Circuit
footprint VSSOP8_0.65 (Footprint not found)
pins on every part: 4 -V (power), 8 +V (power)
part A pins: 1 OUT A (out), 2 -IN A (in), 3 +IN A (in)
part B pins: 5 +IN B (in), 6 -IN B (in), 7 OUT B (out)

## AD8676BRMZ
designator U?
Double Channel Wide Bandwidth Operational Amplifier, 10 MHz BW, 2.5 V/us SR, Industrial, 8-pin SOP (RM-8), Tube; Generic Part Number: AD8676; PartNumber: AD8676BRMZ; Amplifiers Per Package: 2; Input Bias Current: 2.4nA; Input Offset Voltage: 12uV; Iq/Amp: 2.7mA; Small Signal Bandwidth: 10MHz; V Span Max: 36V; V Span Min: 10V; DatasheetVersion: Rev. C; PackageReference: RM-8; PackageDescription: 8-Pin Mini Small Outline Package, Body 3 x 3 mm, Pitch 0.65 mm; Supplier Part Number 1: AD8676BRMZ-ND; Supplier Part Number 2: 45P6472; Slew Rate: 2.5V/us; Mounting Technology: Surface Mount; Code_JEDEC: MO-187-AA; ComponentLink1Description: Manufacturer URL; ComponentLink2Description: Datasheet; ComponentLink3Description: Package Specification; ComponentLink4Description: Reference Circuit
footprint VSSOP8_0.65 (Footprint not found)
pins on every part: 4 -V (power), 8 +V (power)
part A pins: 1 OUT A (out), 2 -IN A (in), 3 +IN A (in)
part B pins: 5 +IN B (in), 6 -IN B (in), 7 OUT B (out)

## AD8677AUJZ-R2
designator U?
Single Channel Low Offset Voltage Operational Amplifier, 600 KHz BW, 200 mV/us SR, Industrial, 5-pin SOT23 (UJ-5), Reel; Generic Part Number: AD8677; PartNumber: AD8677AUJZ-R2; Amplifiers Per Package: 1; Input Bias Current: 200pA; Input Offset Voltage: 45uV; Iq/Amp: 1.3mA; Small Signal Bandwidth: 600KHz; V Span Max: 36V; V Span Min: 10V; DatasheetVersion: Rev. A; PackageVersion: 100708-A; PackageReference: UJ-5; PackageDescription: 5-Pin Thin Small Outline Transistor Package, Body 2.9 x 1.6 mm, Pitch 0.95 mm; Supplier Part Number 1: AD8677AUJZ-R2TR-ND; Supplier Part Number 2: AD8677AUJZ-R2CT-ND; Supplier Part Number 3: AD8677AUJZ-R2DKR-ND; Supplier Part Number 4: 12M9167; Slew Rate: 200mV/us; Mounting Technology: Surface Mount; Code_JEDEC: MO-193-AB; ComponentLink1Description: Manufacturer URL; ComponentLink2Description: Datasheet; ComponentLink3Description: Package Specification
footprint SOT23-5 (Footprint not found)
pins: 1 OUT (out), 2 -V (power), 3 +IN (in), 4 -IN (in), 5 +V (power)

## AD8682ARMZ
designator U?
Double Channel Low Supply Current Operational Amplifier, 3.5 MHz BW, 9V/us SR, Industrial, 8-pin SOP (RM-8), Tube; Generic Part Number: AD8682; PartNumber: AD8682ARMZ; Amplifiers Per Package: 2; Input Bias Current: 6pA; Input Offset Voltage: 350uV; Iq/Amp: 250uA; Small Signal Bandwidth: 3.5MHz; V Span Max: 32V; V Span Min: 9V; DatasheetVersion: Rev. B; PackageReference: RM-8; PackageDescription: 8-Pin Mini Small Outline Package, Body 3 x 3 mm, Pitch 0.65 mm; Supplier Part Number 1: AD8682ARMZ-ND; Slew Rate: 9V/us; Mounting Technology: Surface Mount; Code_JEDEC: MO-187-AA; ComponentLink1Description: Manufacturer URL; ComponentLink2Description: Datasheet; ComponentLink3Description: Package Specification
footprint VSSOP8_0.65 (Footprint not found)
pins on every part: 4 -V (power), 8 +V (power)
part A pins: 1 OUT A (out), 2 -IN A (in), 3 +IN A (in)
part B pins: 5 +IN B (in), 6 -IN B (in), 7 OUT B (out)

## AD8691AKSZ-R2
designator U?
Single Channel Wide Bandwidth Operational Amplifier, 10 MHz BW, 5 V/us SR, Industrial, 5-pin SOT23 (KS-5), Reel; Generic Part Number: AD8691; PartNumber: AD8691AKSZ-R2; Amplifiers Per Package: 1; Automotive Qualified: Yes; Input Bias Current: 200fA; Input Offset Voltage: 400uV; Iq/Amp: 1.05mA; Slew Rate: 5V/us; Small Signal Bandwidth: 10MHz; V Span Max: 6V; V Span Min: 2.7V; DatasheetVersion: Rev. E; PackageVersion: 072809-A; PackageReference: KS-5; PackageDescription: 5-Pin Thin Shrink Small Outline Transistor Package, Body 2 x 1.25 mm, Pitch 0.65 mm; Supplier Part Number 1: AD8691AKSZ-R2TR-ND; Supplier Part Number 2: AD8691AKSZ-R2CT-ND; Supplier Part Number 3: AD8691AKSZ-R2DKR-ND; Supplier Part Number 4: 1078265; Supplier Part Number 5: 1078265RL; Supplier Part Number 6: 31M4609; Supplier Part Number 7: 59K7077; Mounting Technology: Surface Mount; Code_JEDEC: MO-203-AA; ComponentLink1Description: Manufacturer URL; ComponentLink2Description: Datasheet; ComponentLink3Description: Package Specification
footprint SOT353 (Footprint not found)
pins: 1 OUT A (out), 2 -V (power), 3 +IN A (in), 4 -IN A (in), 5 +V (power)

## AD8691AUJZ-R2
designator U?
Single Channel Wide Bandwidth Operational Amplifier, 10 MHz BW, 5 V/us SR, Industrial, 5-pin SOT23 (UJ-5), Reel; Generic Part Number: AD8691; PartNumber: AD8691AUJZ-R2; Amplifiers Per Package: 1; Automotive Qualified: Yes; Input Bias Current: 200fA; Input Offset Voltage: 400uV; Iq/Amp: 1.05mA; Slew Rate: 5V/us; Small Signal Bandwidth: 10MHz; V Span Max: 6V; V Span Min: 2.7V; DatasheetVersion: Rev. E; PackageVersion: 100708-A; PackageReference: UJ-5; PackageDescription: 5-Pin Thin Small Outline Transistor Package, Body 2.9 x 1.6 mm, Pitch 0.95 mm; Supplier Part Number 1: AD8691AUJZ-R2TR-ND; Supplier Part Number 2: AD8691AUJZ-R2CT-ND; Supplier Part Number 3: AD8691AUJZ-R2DKR-ND; Supplier Part Number 4: 59K7080; Mounting Technology: Surface Mount; Code_JEDEC: MO-193-AB; ComponentLink1Description: Manufacturer URL; ComponentLink2Description: Datasheet; ComponentLink3Description: Package Specification
footprint SOT23-5 (Footprint not found)
pins: 1 OUT (out), 2 -V (power), 3 +IN (in), 4 -IN (in), 5 +V (power)

## AD8691WAUJZ-R7
designator U?
Single Channel Wide Bandwidth Operational Amplifier, 10 MHz BW, 5 V/us SR, Automotive, 5-pin SOT23 (UJ-5), Reel; Generic Part Number: AD8691; PartNumber: AD8691WAUJZ-R7; Amplifiers Per Package: 1; Automotive Qualified: Yes; Input Bias Current: 200fA; Input Offset Voltage: 400uV; Iq/Amp: 1.05mA; Slew Rate: 5V/us; Small Signal Bandwidth: 10MHz; V Span Max: 6V; V Span Min: 2.7V; DatasheetVersion: Rev. E; PackageVersion: 100708-A; PackageReference: UJ-5; PackageDescription: 5-Pin Thin Small Outline Transistor Package, Body 2.9 x 1.6 mm, Pitch 0.95 mm; Supplier Part Number 1: AD8691WAUJZ-R7TR-ND; Supplier Part Number 2: AD8691WAUJZ-R7CT-ND; Supplier Part Number 3: AD8691WAUJZ-R7DKR-ND; Mounting Technology: Surface Mount; Code_JEDEC: MO-193-AB; ComponentLink1Description: Manufacturer URL; ComponentLink2Description: Datasheet; ComponentLink3Description: Package Specification
footprint SOT23-5 (Footprint not found)
pins: 1 OUT (out), 2 -V (power), 3 +IN (in), 4 -IN (in), 5 +V (power)

## AD8801AR
designator U?
Octal 8-Bit MDAC with Power Shutdown, -40 to +85 degC, R-16, Tube; Generic Part Number: AD8801; PartNumber: AD8801AR; # DAC Outputs: 8; Max V+: 5.5V; Op Pwr Diss: 20mW; Settling Time: 600ns; Single Supply: Yes; DatasheetVersion: Rev.A; PackageVersion: 060606-A; PackageReference: R-16; PackageDescription: 16-Lead Standard Small Outline Package [SOIC_N] Narrow Body; Supplier Part Number 1: AD8801AR-ND; Supplier Part Number 2: 584-AD8801AR; Packing: Tube; Resolution (Bits): 8; RoHS: N; Mounting Technology: Surface Mount; Code_JEDEC: MS-012-AC; ComponentLink1Description: Manufacturer URL; ComponentLink2Description: Datasheet; ComponentLink3Description: Package Specification; ComponentLink4Description: Product URL
footprint SOIC16_1.27 (Footprint not found)
pins: 1 VREFH (in) "Common DAC Reference Input", 2 O1 (out) "DAC Output #1, Addr = 000", 3 O2 (out) "DAC Output #2, Addr = 001", 4 O3 (out) "DAC Output #3, Addr = 010", 5 O4 (out) "DAC Output #4, Addr = 011", 6 ~{SHDN} (in) "Reference input open circuit, active low, all DAC outputs open circuit. DAC latch settings maintained.", 7 ~{CS} (in) "Chip Select Input, active low. When C\S\ returns high, data in the serial input register is decoded based on the address bits and loaded into the target DAC register.", 8 GND (power) "Ground", 9 CLK (in) "Serial Clock Input, Positive Edge Triggered", 10 SDI (in) "Serial Data Input", 11 O5 (out) "DAC Output #5, Addr = 100", 12 O6 (out) "DAC Output #6, Addr = 101", 13 O7 (out) "DAC Output #7, Addr = 110", 14 O8 (out) "DAC Output #8, Addr = 111", 15 ~{RS} (in) "Asynchronous preset to midscale output setting,active low. Loads all DAC latches with 80H.", 16 VDD (power) "Positive power supply, specified for operation at both +3 V and +5 V."

## AD8801ARZ
designator U?
Octal 8-Bit MDAC with Power Shutdown, -40 to +85 degC, R-16, Pb-Free, Tube; Generic Part Number: AD8801; PartNumber: AD8801ARZ; # DAC Outputs: 8; Max V+: 5.5V; Op Pwr Diss: 20mW; Settling Time: 600ns; Single Supply: Yes; DatasheetVersion: Rev.A; PackageVersion: 060606-A; PackageReference: R-16; PackageDescription: 16-Lead Standard Small Outline Package [SOIC_N] Narrow Body; Supplier Part Number 1: AD8801ARZ-ND; Supplier Part Number 2: 1311358; Supplier Part Number 3: 59K7101; Supplier Part Number 4: 584-AD8801ARZ; Packing: Tube; Resolution (Bits): 8; RoHS: Y; Mounting Technology: Surface Mount; Code_JEDEC: MS-012-AC; ComponentLink1Description: Manufacturer URL; ComponentLink2Description: Datasheet; ComponentLink3Description: Package Specification; ComponentLink4Description: Product URL
footprint SOIC16_1.27 (Footprint not found)
pins: 1 VREFH (in) "Common DAC Reference Input", 2 O1 (out) "DAC Output #1, Addr = 000", 3 O2 (out) "DAC Output #2, Addr = 001", 4 O3 (out) "DAC Output #3, Addr = 010", 5 O4 (out) "DAC Output #4, Addr = 011", 6 ~{SHDN} (in) "Reference input open circuit, active low, all DAC outputs open circuit. DAC latch settings maintained.", 7 ~{CS} (in) "Chip Select Input, active low. When C\S\ returns high, data in the serial input register is decoded based on the address bits and loaded into the target DAC register.", 8 GND (power) "Ground", 9 CLK (in) "Serial Clock Input, Positive Edge Triggered", 10 SDI (in) "Serial Data Input", 11 O5 (out) "DAC Output #5, Addr = 100", 12 O6 (out) "DAC Output #6, Addr = 101", 13 O7 (out) "DAC Output #7, Addr = 110", 14 O8 (out) "DAC Output #8, Addr = 111", 15 ~{RS} (in) "Asynchronous preset to midscale output setting,active low. Loads all DAC latches with 80H.", 16 VDD (power) "Positive power supply, specified for operation at both +3 V and +5 V."